# Altium footprint library THT.PcbLib: 60 footprints (part 3 of 4)
Each footprint in its own frame and in the unit in brackets; x right, y up, seen from the top. Pads: shape width x height; smd on the part's side, far side on the other; paste and mask are expansions set on the pad; w line width, h text height; cw(c..) or ccw(c..) is an arc to the next point about the centre after c.
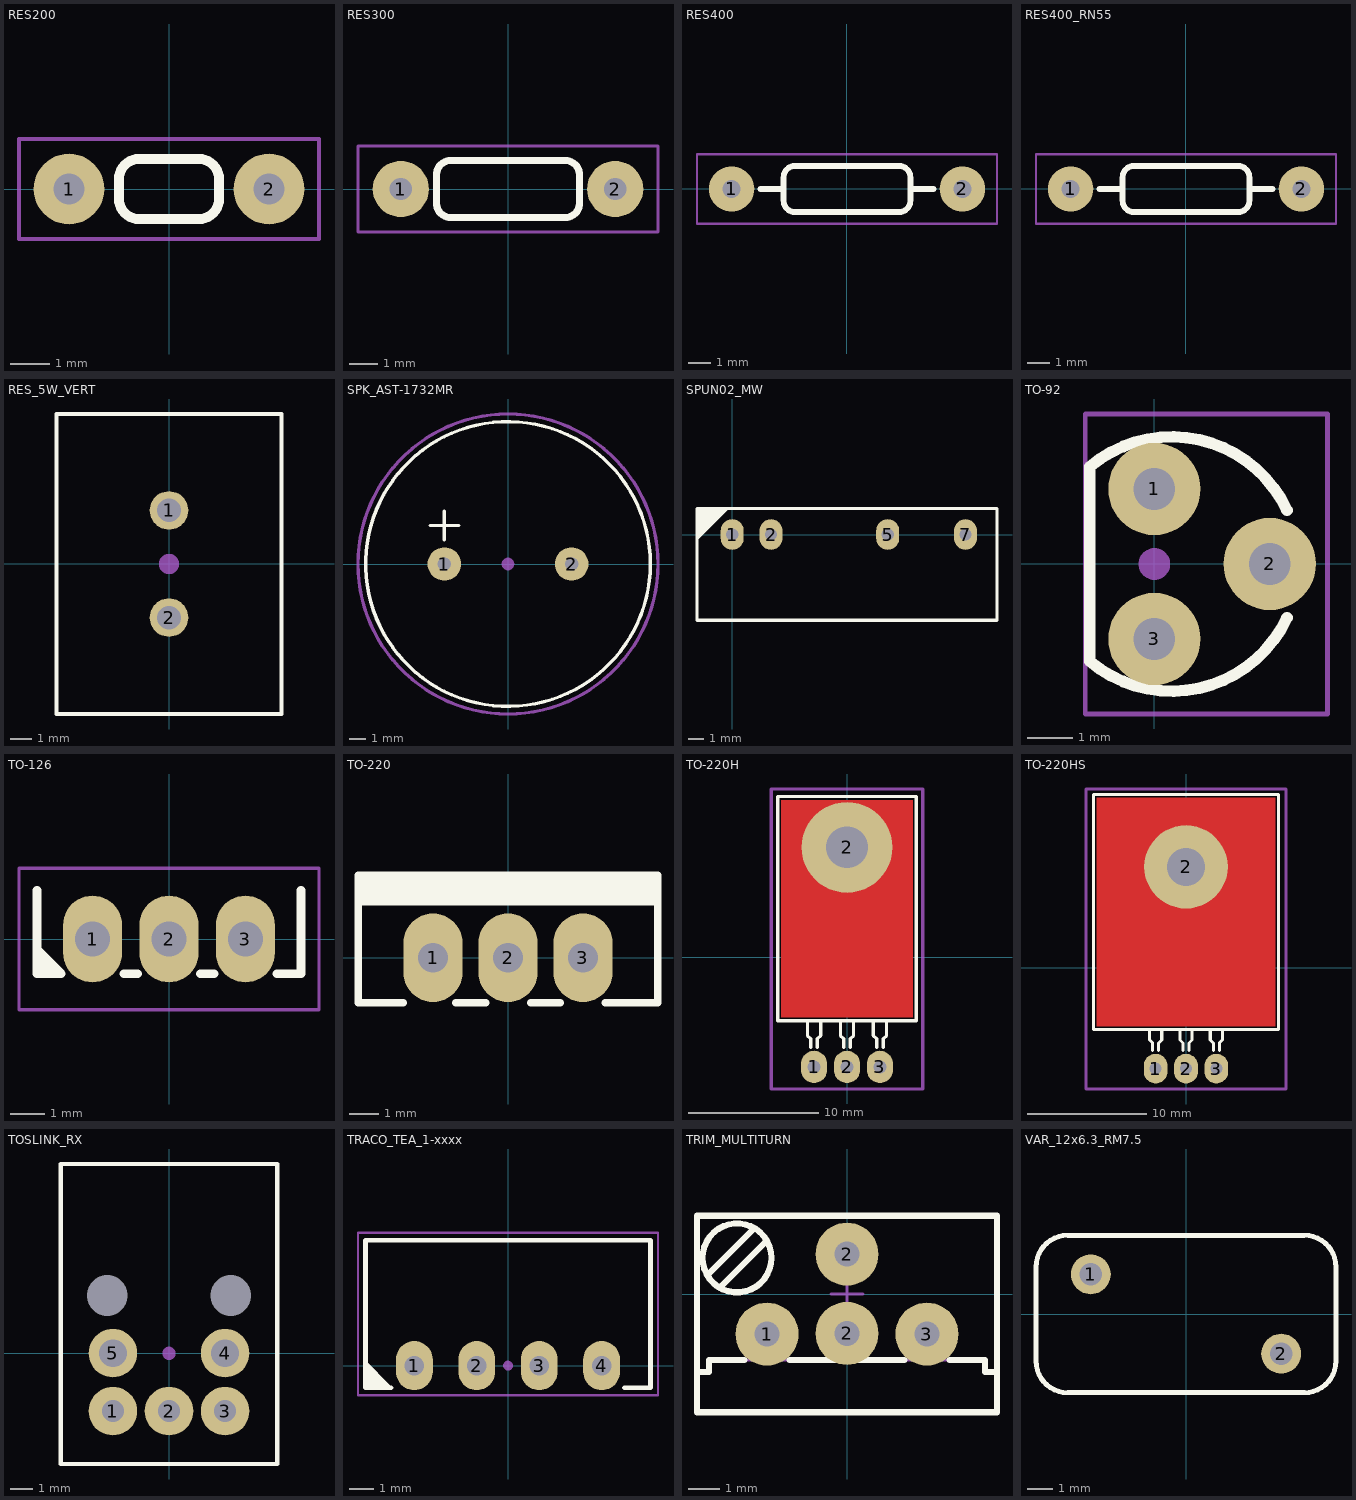
[diagram p2: the footprints below, top view; thin cyan lines are the x and y axes]

## RES200 [mm]
pads (2):
  round 1.8 hole 0.8: 1(-2.54,0) 2(2.54,0)
Top Overlay:
  lines w0.254: -1.27,-0.254 ccw(c-0.762,-0.254) -0.762,-0.762 0.762,-0.762 ccw(c0.762,-0.254) 1.27,-0.254 1.27,0.254 ccw(c0.762,0.254) 0.762,0.762 -0.762,0.762 ccw(c-0.762,0.254) -1.27,0.254 -1.27,-0.254
Mechanical 15:
  lines w0.1: -3.81,-1.27 -3.81,1.27 3.81,1.27 3.81,-1.27 -3.81,-1.27
3D body "User Library-CCF50_10K0_b5.STEP": height 1.7, standoff -2.35, extent -2.825,-0.794 2.825,0.794

## RES300 [mm]
pads (2):
  round 2 hole 0.8: 1(-3.81,0) 2(3.81,0)
Top Overlay:
  lines w0.254: -2.54,-0.508 ccw(c-2.032,-0.508) -2.032,-1.016 2.032,-1.016 ccw(c2.032,-0.508) 2.54,-0.508 2.54,0 2.54,0.508 ccw(c2.032,0.508) 2.032,1.016 -2.032,1.016 ccw(c-2.032,0.508) -2.54,0.508 -2.54,-0.508
Mechanical 15:
  lines w0.1: -5.334,-1.524 -4.064,-1.524 5.334,-1.524 5.334,1.524 -5.334,1.524 -5.334,-1.524
3D body "User Library-R-Axial-0_25W-7_62.step": height 2.6, standoff -3.6, extent -4.11,-1.204 4.11,1.204

## RES400 [mm]
pads (2):
  round 2 hole 0.8: 1(-5.08,0) 2(5.08,0)
Top Overlay:
  lines w0.254: -3.81,0 -2.794,0 ; 3.81,0 2.794,0 ; 2.794,0 2.794,-0.508 cw(c2.286,-0.508) 2.286,-1.016 -2.286,-1.016 cw(c-2.286,-0.508) -2.794,-0.508 -2.794,0.508 cw(c-2.286,0.508) -2.286,1.016 2.286,1.016 cw(c2.286,0.508) 2.794,0.508 2.794,0
Mechanical 15:
  lines w0.1: -6.604,-1.524 -5.334,-1.524 6.604,-1.524 6.604,1.524 -6.604,1.524 -6.604,-1.524
3D body "User Library-R-Axial-0_25W-10_16.step": height 2.6, standoff -3.6, extent -5.38,-1.203 5.38,1.204

## RES400_RN55 [mm]
pads (2):
  round 2 hole 0.8: 1(-5.08,0) 2(5.08,0)
Top Overlay:
  lines w0.254: -3.81,0 -2.794,0 ; 3.81,0 2.794,0 ; 2.794,0 2.794,0.508 ccw(c2.286,0.508) 2.286,1.016 -2.286,1.016 ccw(c-2.286,0.508) -2.794,0.508 -2.794,-0.508 ccw(c-2.286,-0.508) -2.286,-1.016 2.286,-1.016 ccw(c2.286,-0.508) 2.794,-0.508 2.794,0
Mechanical 15:
  lines w0.1: -6.604,-1.524 -5.334,-1.524 6.604,-1.524 6.604,1.524 -6.604,1.524 -6.604,-1.524
3D body "RES1016-720X250.stp": height 2.5, standoff -3.2, extent -5.38,-1.25 5.38,1.25

## RES_5W_VERT [mm]
pads (2):
  round 1.8 / inner round 1.8 / far side round 3 hole 1.1: 1(0,2.5) 2(0,-2.5)
Top Overlay:
  lines w0.2: -5.25,-7 5.25,-7 5.25,7 -5.25,7 -5.25,-7
Mechanical 14:
  lines w0.1: -5.25,-7 5.25,-7 5.25,7 -5.25,7 -5.25,-7
Mechanical 15:
  circle w0.5: c0,0 r0.224
3D body "5Wres_vert.STEP": height 25, standoff -3.2, extent -5.25,-7 5.25,7

## SPK_AST-1732MR [mm]
pads (2):
  round 2 hole 0.8: 1(-3.8,0) 2(3.8,0)
Top Overlay:
  circle w0.2: c0,0 r8.5
  lines w0.2: -4.65,2.3 -2.95,2.3 ; -3.8,1.45 -3.8,3.15
Mechanical 15:
  circle w0.4: c0,0 r0.175
  circle w0.2: c0,0 r8.956
3D body: height 8, standoff 0, extent -8.477,-8.478 8.523,8.522

## SPUN02_MW [mm]
pads (4):
  oval 1.5x2 hole 0.8: 1(0,0) 2(2.54,0) 5(10.16,0) 7(15.24,0)
Top Overlay:
  region: -0.15,1.75 -2.25,-0.35 -2.25,1.75
  lines w0.2: -2.3,-5.6 -2.3,1.7 17.3,1.7 17.3,-5.6 -2.3,-5.6
3D body "SPUN02.STEP": height 10.2, standoff -4.1, extent -2.275,-5.55 17.325,1.65

## TO-92 [mil]
height 397.64
pads (3):
  round 80 hole 36: 1(0,65) 2(100,0) 3(0,-65)
Top Overlay:
  lines w10: 114.91,-46.59 cw(c15,0) -55.86,-84.45 -55.86,84.45 cw(c15,0) 114.91,46.59
Mechanical 15:
  circle w15.75: c0,0 r5.85
  lines w3.94: -60,-130 150,-130 150,130 -60,130 -60,-130
3D body "TO-92_A.stp": height 404.72, standoff -100, extent -54.52,-94.57 107.49,94.56

## TO-126 [mm]
pads (3):
  oval 1.7x2.5 hole 1: 1(-2.2,0) 2(0,0) 3(2.2,0)
Top Overlay:
  region: -3.1,-1 -3.9,-0.2 -3.9,-0.9 -3.8,-1
  lines w0.254: -3.8,-0.3 -3.1,-1 -3.8,-1 -3.8,1.4 ; -1.3,-1 -0.9,-1 ; 0.9,-1 1.3,-1 ; 3.1,-1 3.8,-1 3.8,1.4
Mechanical 15:
  lines w0.1: -4.318,1.5 -4.318,-2.032 4.318,-2.032 4.318,2.032 -4.318,2.032 -4.318,1.524
3D body "User Library-TO-126 (SOT32) Grey PCB.step": height 14.19, standoff -2.54, extent -3.8,-1 3.8,1.55

## TO-220 [mm]
pads (3):
  oval 2x3 hole 1: 1(-2.54,0) 2(0,0) 3(2.54,0)
Top Overlay:
  region: -5.08,2.794 5.08,2.794 5.08,1.778 -5.08,1.778
  lines w0.254: -3.556,-1.524 -5.08,-1.524 -5.08,2.54 -5.08,2.794 5.08,2.794 5.08,-1.524 3.302,-1.524 ; -1.778,-1.524 -0.762,-1.524 ; 0.762,-1.524 1.778,-1.524
3D body "User Library-TO220-A PCB.step": height 19.99, standoff -3.5, extent -4.95,-1.55 4.95,2.907

## TO-220H [mm]
pads (4):
  oval 2x2.5 hole 1: 1(-2.54,-8.458) 2(0,-8.458) 3(2.54,-8.458)
  round 7 hole 3.2: 2(0,8.458)
Top Layer:
  rectangle: -5.08,-4.648 5.08,12.116
Top Overlay:
  lines w0.254: -3.048,-4.902 -3.048,-6.045 -2.794,-6.299 -2.794,-6.934 ; -2.286,-6.934 -2.286,-6.299 -2.032,-6.045 -2.032,-4.902 ; -0.508,-4.902 -0.508,-6.045 -0.254,-6.299 -0.254,-6.934 ; 0.254,-6.934 0.254,-6.299 0.508,-6.045 0.508,-4.902 ; 2.032,-4.902 2.032,-6.045 2.286,-6.299 2.286,-6.934 ; 2.794,-6.934 2.794,-6.299 3.048,-6.045 3.048,-4.902 ; -5.334,-4.902 5.334,-4.902 5.334,12.37 -5.334,12.37 -5.334,-4.902
Mechanical 15:
  circle w0.4: c0,0 r0.149
  lines w0.254: -5.842,-10.16 5.842,-10.16 5.842,12.954 -5.842,12.954 -5.842,-10.16
3D body "User Library-TO220-AB-H PCB.step": height 4.55, standoff -3.58, extent -4.95,-8.705 4.95,11.508

## TO-220HS [mm]
pads (4):
  oval 2x2.5 hole 1: 1(-2.54,-8.458) 2(0,-8.458) 3(2.54,-8.458)
  round 7 hole 3.2: 2(0,8.458)
Top Layer:
  rectangle: -7.493,-4.902 7.493,14.275
Top Overlay:
  lines w0.254: -3.048,-5.156 -3.048,-6.045 -2.794,-6.299 -2.794,-6.934 ; -2.286,-6.934 -2.286,-6.299 -2.032,-6.045 -2.032,-5.156 ; -0.508,-5.156 -0.508,-6.045 -0.254,-6.299 -0.254,-6.934 ; 0.254,-6.934 0.254,-6.299 0.508,-6.045 0.508,-5.156 ; 2.032,-5.156 2.032,-6.045 2.286,-6.299 2.286,-6.934 ; 2.794,-6.934 2.794,-6.299 3.048,-6.045 3.048,-5.156 ; -7.747,-5.156 7.747,-5.156 7.747,14.529 -7.747,14.529 -7.747,-5.156
Mechanical 15:
  circle w0.4: c0,0 r0.149
  lines w0.254: -8.382,-10.16 0,-10.16 8.382,-10.16 8.382,14.986 -8.382,14.986 -8.382,-10.16
3D body "User Library-TO220-AB-H PCB.step": height 5.55, standoff -2.58, extent -4.95,-8.705 4.95,11.508
3D body "User Library-STONECOLD_HS-S03.step": height 13.54, standoff 0, extent -7.44,-4.877 7.442,14.173

## TOSLINK_RX [mm]
height 3.1
pads (7):
  round 0.203 hole 1.85: 0(-2.8,2.618) 0(2.8,2.618)
  round 2.2 hole 1: 1(-2.54,-2.618) 2(0,-2.618) 3(2.54,-2.618)
  round 2.2 hole 1.25: 4(2.54,0.008) 5(-2.54,0.008)
Top Overlay:
  lines w0.2: -4.9,-5.018 4.9,-5.018 4.9,-4.517 4.9,8.582 -4.9,8.582 -4.9,-5.018
Mechanical 15:
  circle w0.4: c0,0 r0.1
3D body "User Library-TORX147PL(f,t).SLDPRT": height 10.15, standoff -3.45, extent -4.85,-4.942 4.85,8.559

## TRACO_TEA_1-xxxx [mm]
pads (4):
  oval 1.5x2 hole 0.8: 1(-3.81,0) 2(-1.27,0) 3(1.27,0) 4(3.81,0)
Top Overlay:
  region: -5.85,0.25 -4.75,-0.85 -5.85,-0.85
  lines w0.2: -4.76,-0.9 -5.8,-0.9 -5.8,5.1 5.8,5.1 5.8,-0.9 4.74,-0.9
Mechanical 15:
  circle w0.2: c0,0 r0.1
  lines w0.1: -6.1,-1.2 6.1,-1.2 6.1,5.4 -6.1,5.4 -6.1,-1.2
3D body "tea1_3d_drawing.stp": height 10.2, standoff -4, extent -5.8,-0.9 5.8,5.1

## TRIM_MULTITURN [mm] "Trimming Potentiometer BOURNS 3296Y Series"
height 11.55
pads (4):
  round 2 hole 0.8: 1(-2.54,-1.27) 2(0,-1.25) 2(0,1.27) 3(2.54,-1.27)
Top Overlay:
  circle w0.2: c-3.495,1.15 r1.095
  lines w0.2: -4.442,0.599 -2.944,2.097 ; -4.046,0.203 -2.548,1.701 ; -3.265,-2.095 -4.385,-2.095 -4.385,-2.475 -4.765,-2.475 ; -1.816,-2.095 1.816,-2.095 ; 3.265,-2.095 4.385,-2.095 4.385,-2.475 4.765,-2.475 ; -4.765,-2.475 -4.765,-3.75 4.765,-3.75 4.765,-2.475 ; -4.765,-2.475 -4.765,2.485 4.765,2.485 4.765,-2.475
Mechanical 8:
  lines w0.1: -3.04,-1.27 -2.54,-1.27 ; -2.54,-1.77 -2.54,-1.27 ; -2.54,-0.77 -2.54,-1.27 ; -2.04,-1.27 -2.54,-1.27 ; -0.5,0 0,0 ; -0.5,1.27 0,1.27 ; 0,-0.5 0,0 ; 0,0.5 0,0 ; 0,0.77 0,1.27 ; 0,1.77 0,1.27 ; 0.5,0 0,0 ; 0.5,1.27 0,1.27 ; 2.04,-1.27 2.54,-1.27 ; 2.54,-1.77 2.54,-1.27 ; 2.54,-0.77 2.54,-1.27 ; 3.04,-1.27 2.54,-1.27
Mechanical 14:
  circle w0.1: c-3.495,1.15 r1.095
  lines w0.1: -4.442,0.599 -2.944,2.097 ; -4.046,0.203 -2.548,1.701 ; -4.765,-2.475 -4.765,2.485 4.765,2.485 4.765,-2.475 4.385,-2.475 4.385,-2.095 -4.385,-2.095 -4.385,-2.475 -4.765,-2.475
3D body "TRIM_BOURNS_3296Y.stp": height 11.49, standoff -3.42, extent -4.765,-2.475 4.765,2.485

## VAR_12x6.3_RM7.5 [mm] "EPCOS S10K460 Metal Oxyde Varistor, Body 6.3X12mm"
height 15
pads (2):
  round 1.6 / inner round 1.6 / far side round 2.5 hole 0.9: 1(-3.81,1.587) 2(3.81,-1.587)
Top Overlay:
  lines w0.2: 4.73,-3.15 ccw(c4.73,-1.88) 6,-1.88 6,1.88 ccw(c4.73,1.88) 4.73,3.15 -4.73,3.15 ccw(c-4.73,1.88) -6,1.88 -6,-1.88 ccw(c-4.73,-1.88) -4.73,-3.15 4.75,-3.15
Mechanical 14:
  lines w0.1: -6,-1.88 ccw(c-4.73,-1.88) -4.73,-3.15 4.73,-3.15 ccw(c4.73,-1.88) 6,-1.88 6,1.88 ccw(c4.73,1.88) 4.73,3.15 -4.73,3.15 ccw(c-4.73,1.88) -6,1.88 -6,-1.88
3D body "VAR_EPCOS_B72210S0461K101.stp": height 15, standoff -3.6, extent -6,-3.15 6,3.15